# Altium footprint library Library 3D.PcbLib: 288 footprints (part 5 of 18)
Each footprint in its own frame and in the unit in brackets; x right, y up, seen from the top. Pads: shape width x height; smd on the part's side, far side on the other; paste and mask are expansions set on the pad; w line width, h text height; cw(c..) or ccw(c..) is an arc to the next point about the centre after c.
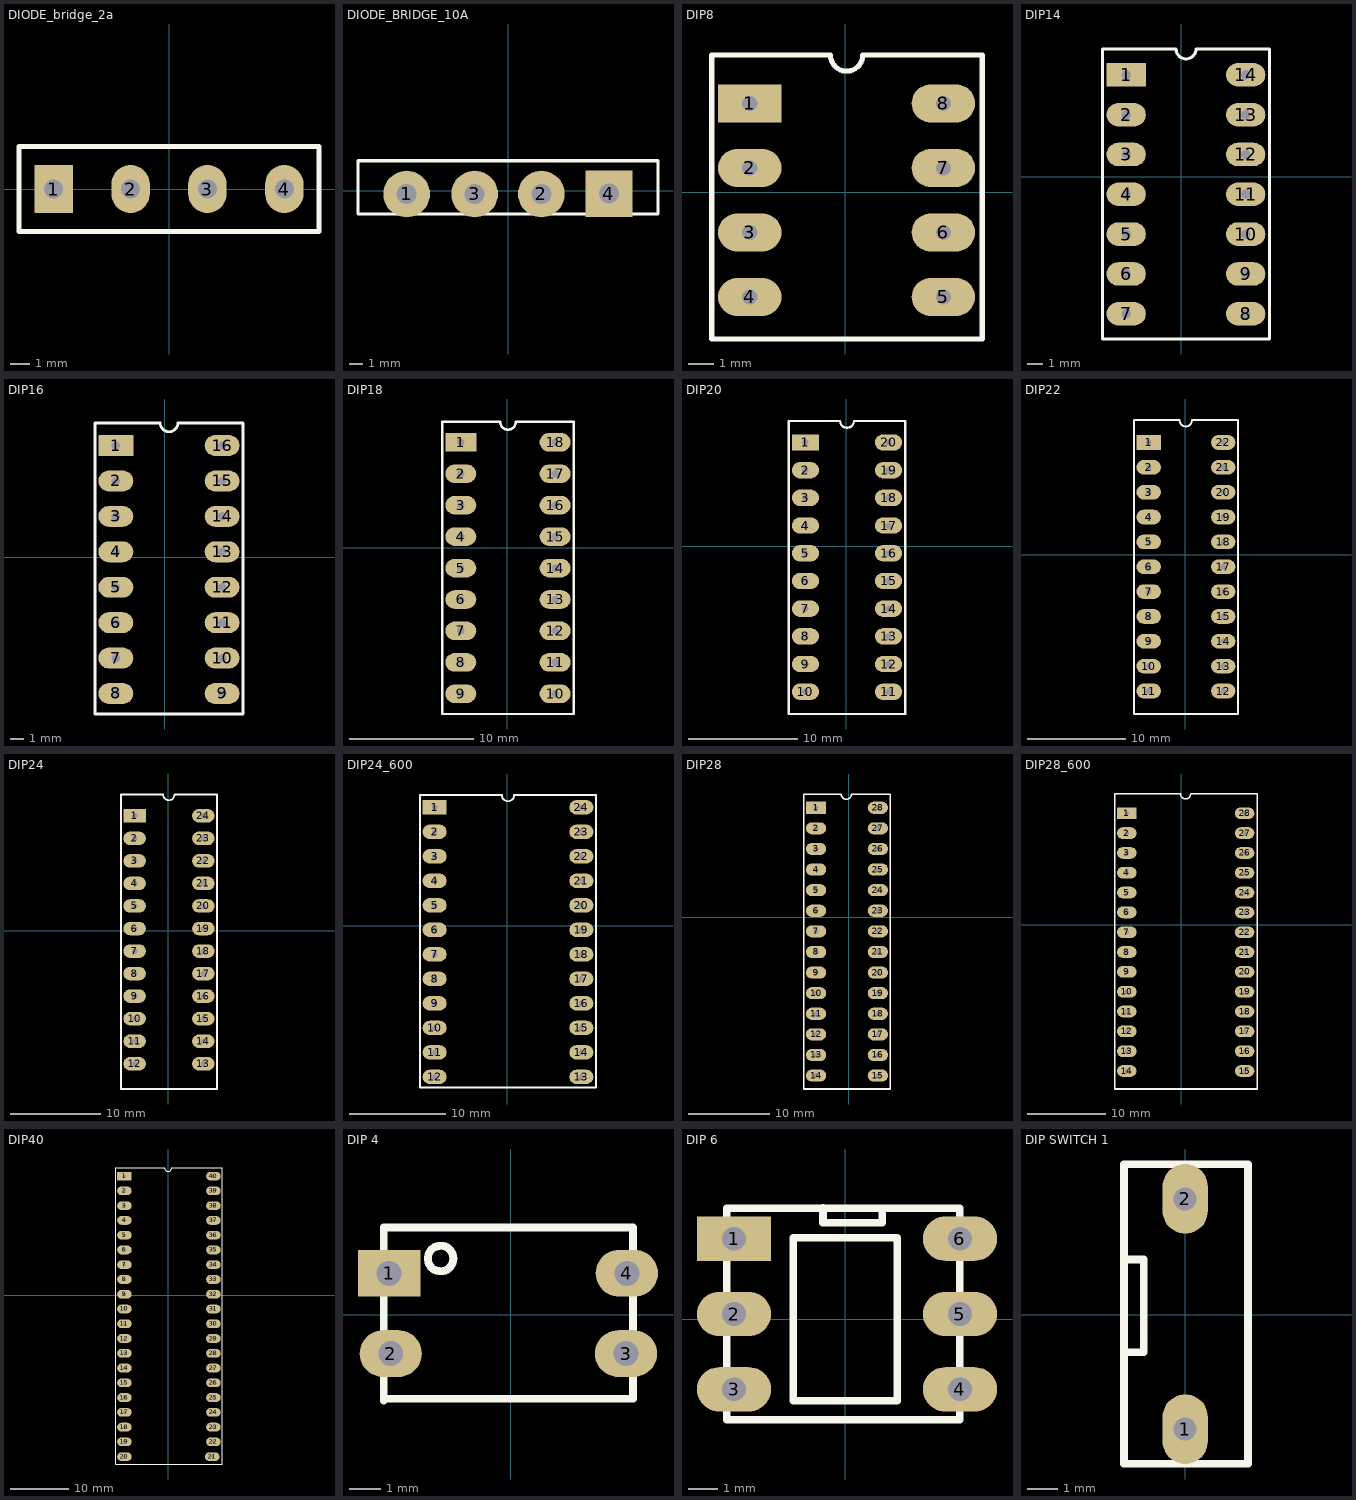
[diagram p4: the footprints below, top view; thin cyan lines are the x and y axes]

## DIODE_bridge_2a [mm]
pads (4):
  rect 2x2.5 hole 1: 1(-6,0)
  oval 2x2.5 hole 1: 2(-2,0) 3(2,0) 4(6,0)
Top Overlay:
  lines w0.254: -7.8,-2.2 7.8,-2.2 7.8,2.2 -7.8,2.2 -7.8,-2.2
3D body "Diode_Bridge.STEP": height 11, standoff -9, extent -7.5,-1.9 7.5,1.9

## DIODE_BRIDGE_10A [mm]
pads (4):
  round 3.5 hole 1.5: 1(-7.6,-0.25) 2(2.5,-0.25) 3(-2.5,-0.25)
  rect 3.5x3.5 hole 1.5: 4(7.575,-0.225)
Top Overlay:
  lines w0.254: -11.25,-1.75 11.25,-1.75 11.25,2.25 -11.25,2.25 -11.25,-1.75
3D body "User Library-GBU Vishay.STEP": height 21, standoff -15.55, extent -11.15,-1.5 11.15,2.06

## DIP8 [mm]
pads (8):
  rect 2.5x1.5 hole 0.6: 1(-3.75,3.5)
  oval 2.5x1.5 hole 0.6: 2(-3.75,0.96) 3(-3.75,-1.58) 4(-3.75,-4.12) 5(3.87,-4.12) 6(3.87,-1.58) 7(3.87,0.96) 8(3.87,3.5)
Top Overlay:
  lines w0.2: -5.25,-5.775 -5.25,5.4 -0.575,5.4 ccw(c0.06,5.4) 0.695,5.4 5.4,5.4 5.4,-5.775 -5.25,-5.775
3D body "User Library-DIP8-300-metric.STEP": height 4.5, standoff -3.5, extent -3.805,-5.6 3.955,5.2

## DIP14 [mm]
pads (14):
  rect 2.5x1.5 hole 0.6: 1(-3.5,6.5)
  oval 2.5x1.5 hole 0.6: 2(-3.5,3.96) 3(-3.5,1.42) 4(-3.5,-1.12) 5(-3.5,-3.66) 6(-3.5,-6.2) 7(-3.5,-8.74) 8(4.12,-8.74) 9(4.12,-6.2) 10(4.12,-3.66) 11(4.12,-1.12) 12(4.12,1.42) 13(4.12,3.96) 14(4.12,6.5)
Top Overlay:
  lines w0.2: -0.325,8.15 -5.025,8.15 -5.025,-10.35 5.65,-10.35 5.65,8.15 0.945,8.15 ; -0.32,8.15 ccw(c0.315,8.15) 0.95,8.15
3D body "User Library-DIP14-300-metric.STEP": height 4.5, standoff -3.5, extent -3.58,-10.125 4.18,7.975

## DIP16 [mm]
pads (16):
  rect 2.5x1.5 hole 0.6: 1(-3.5,8)
  oval 2.5x1.5 hole 0.6: 2(-3.5,5.46) 3(-3.5,2.92) 4(-3.5,0.38) 5(-3.5,-2.16) 6(-3.5,-4.7) 7(-3.5,-7.24) 8(-3.5,-9.78) 9(4.12,-9.78) 10(4.12,-7.24) 11(4.12,-4.7) 12(4.12,-2.16) 13(4.12,0.38) 14(4.12,2.92) 15(4.12,5.46) 16(4.12,8)
Top Overlay:
  lines w0.2: -0.325,9.625 -5,9.625 -5,-11.25 5.625,-11.25 5.625,9.625 0.945,9.625 ; -0.32,9.625 ccw(c0.315,9.625) 0.95,9.625
3D body "User Library-DIP16-300-metric.STEP": height 4.5, standoff -3.5, extent -3.555,-11.1 4.205,9.5

## DIP18 [mm]
pads (18):
  rect 2.5x1.5 hole 0.6: 1(-3.75,8.5)
  oval 2.5x1.5 hole 0.6: 2(-3.75,5.96) 3(-3.75,3.42) 4(-3.75,0.88) 5(-3.75,-1.66) 6(-3.75,-4.2) 7(-3.75,-6.74) 8(-3.75,-9.28) 9(-3.75,-11.82) 10(3.87,-11.82) 11(3.87,-9.28) 12(3.87,-6.74) 13(3.87,-4.2) 14(3.87,-1.66) 15(3.87,0.88) 16(3.87,3.42) 17(3.87,5.96) 18(3.87,8.5)
Top Overlay:
  lines w0.2: -5.25,-13.45 5.375,-13.45 5.375,10.15 0.695,10.15 cw(c0.06,10.15) -0.575,10.15 -5.25,10.15 -5.25,-13.45
3D body "User Library-DIP18-1.STEP": height 4.57, standoff -3.81, extent -3.81,-13.265 4.01,9.975

## DIP20 [mm]
pads (20):
  rect 2.5x1.5 hole 0.6: 1(-3.75,9.5)
  oval 2.5x1.5 hole 0.6: 2(-3.75,6.96) 3(-3.75,4.42) 4(-3.75,1.88) 5(-3.75,-0.66) 6(-3.75,-3.2) 7(-3.75,-5.74) 8(-3.75,-8.28) 9(-3.75,-10.82) 10(-3.75,-13.36) 11(3.87,-13.36) 12(3.87,-10.82) 13(3.87,-8.28) 14(3.87,-5.74) 15(3.87,-3.2) 16(3.87,-0.66) 17(3.87,1.88) 18(3.87,4.42) 19(3.87,6.96) 20(3.87,9.5)
Top Overlay:
  lines w0.2: -0.575,11.475 -5.275,11.475 -5.275,-15.4 5.4,-15.4 5.4,11.475 0.695,11.475 ; -0.57,11.475 ccw(c0.065,11.475) 0.7,11.475
3D body "User Library-DIP20.STEP": height 4.57, standoff -3.81, extent -3.81,-15.215 4.01,11.325

## DIP22 [mm]
pads (22):
  rect 2.5x1.5 hole 0.6: 1(-3.75,11.5)
  oval 2.5x1.5 hole 0.6: 2(-3.75,8.96) 3(-3.75,6.42) 4(-3.75,3.88) 5(-3.75,1.34) 6(-3.75,-1.2) 7(-3.75,-3.74) 8(-3.75,-6.28) 9(-3.75,-8.82) 10(-3.75,-11.36) 11(-3.75,-13.9) 12(3.87,-13.9) 13(3.87,-11.36) 14(3.87,-8.82) 15(3.87,-6.28) 16(3.87,-3.74) 17(3.87,-1.2) 18(3.87,1.34) 19(3.87,3.88) 20(3.87,6.42) 21(3.87,8.96) 22(3.87,11.5)
Top Overlay:
  lines w0.2: -0.595,13.775 ccw(c0.04,13.775) 0.675,13.775 ; -0.575,13.775 -5.275,13.775 -5.275,-16.25 5.4,-16.25 5.4,13.775 0.695,13.775
3D body "SW3dPS-DIP22P3.STEP": height 5.09, standoff -2.48, extent -3.845,-16.035 4.025,13.625

## DIP24 [mm]
pads (24):
  rect 2.5x1.5 hole 0.6: 1(-3.75,12.75)
  oval 2.5x1.5 hole 0.6: 2(-3.75,10.25) 3(-3.75,7.75) 4(-3.75,5.25) 5(-3.75,2.75) 6(-3.75,0.25) 7(-3.75,-2.25) 8(-3.75,-4.75) 9(-3.75,-7.25) 10(-3.75,-9.75) 11(-3.75,-12.25) 12(-3.75,-14.75) 13(3.87,-14.75) 14(3.87,-12.25) 15(3.87,-9.75) 16(3.87,-7.25) 17(3.87,-4.75) 18(3.87,-2.25) 19(3.87,0.25) 20(3.87,2.75) 21(3.87,5.25) 22(3.87,7.75) 23(3.87,10.25) 24(3.87,12.75)
Top Overlay:
  lines w0.2: -0.575,15.1 ccw(c0.05,15.1) 0.675,15.1 ; -0.565,15.1 -5.275,15.1 -5.275,-17.55 5.4,-17.55 5.4,15.1 0.685,15.1
3D body "SW3dPS-DIP24-300.STEP": height 5.08, standoff -2.49, extent -3.86,-17.335 4.01,14.925

## DIP24_600 [mm]
pads (24):
  rect 2.5x1.5 hole 0.6: 1(-7.5,12.25)
  oval 2.5x1.5 hole 0.6: 2(-7.5,9.71) 3(-7.5,7.17) 4(-7.5,4.63) 5(-7.5,2.09) 6(-7.5,-0.45) 7(-7.5,-2.99) 8(-7.5,-5.53) 9(-7.5,-8.07) 10(-7.5,-10.61) 11(-7.5,-13.15) 12(-7.5,-15.69) 13(7.7,-15.69) 14(7.7,-13.15) 15(7.7,-10.61) 16(7.7,-8.07) 17(7.7,-5.53) 18(7.7,-2.99) 19(7.7,-0.45) 20(7.7,2.09) 21(7.7,4.63) 22(7.7,7.17) 23(7.7,9.71) 24(7.7,12.25)
Top Overlay:
  lines w0.2: -9,-16.775 -9,13.52 -0.535,13.52 ccw(c0.1,13.52) 0.735,13.52 9.2,13.52 9.2,-16.775 -9,-16.775
3D body "User Library-DIP24-600-metric.STEP": height 5.5, standoff -3.9, extent -7.55,-16.525 7.75,13.475

## DIP28 [mm]
pads (28):
  rect 2.5x1.5 hole 0.6: 1(-4,13.5)
  oval 2.5x1.5 hole 0.6: 2(-4,10.96) 3(-4,8.42) 4(-4,5.88) 5(-4,3.34) 6(-4,0.8) 7(-4,-1.74) 8(-4,-4.28) 9(-4,-6.82) 10(-4,-9.36) 11(-4,-11.9) 12(-4,-14.44) 13(-4,-16.98) 14(-4,-19.52) 15(3.62,-19.52) 16(3.62,-16.98) 17(3.62,-14.44) 18(3.62,-11.9) 19(3.62,-9.36) 20(3.62,-6.82) 21(3.62,-4.28) 22(3.62,-1.74) 23(3.62,0.8) 24(3.62,3.34) 25(3.62,5.88) 26(3.62,8.42) 27(3.62,10.96) 28(3.62,13.5)
Top Overlay:
  lines w0.2: -5.5,-21.175 -5.5,15.175 -1.23,15.175 -0.9,15.175 ccw(c-0.265,15.175) 0.37,15.175 5.125,15.175 5.125,-21.175 -5.5,-21.175
3D body "SW3dPS-DIP28-300.STEP": height 5.08, standoff -2.49, extent -4.085,-20.975 3.785,15.025

## DIP28_600 [mm]
pads (28):
  rect 2.5x1.5 hole 0.6: 1(-7,14.25)
  oval 2.5x1.5 hole 0.6: 2(-7,11.71) 3(-7,9.17) 4(-7,6.63) 5(-7,4.09) 6(-7,1.55) 7(-7,-0.99) 8(-7,-3.53) 9(-7,-6.07) 10(-7,-8.61) 11(-7,-11.15) 12(-7,-13.69) 13(-7,-16.23) 14(-7,-18.77) 15(8.1,-18.77) 16(8.1,-16.23) 17(8.1,-13.69) 18(8.1,-11.15) 19(8.1,-8.61) 20(8.1,-6.07) 21(8.1,-3.53) 22(8.1,-0.99) 23(8.1,1.55) 24(8.1,4.09) 25(8.1,6.63) 26(8.1,9.17) 27(8.1,11.71) 28(8.1,14.25)
Top Overlay:
  lines w0.2: -0.095,16.725 ccw(c0.54,16.725) 1.175,16.725 ; -0.085,16.725 -8.525,16.725 -8.525,-21.075 9.7,-21.075 9.7,16.725 1.185,16.725
3D body "SW3dPS-DIP28-600.STEP": height 5.7, standoff -2.58, extent -7.22,-20.825 8.27,16.475

## DIP40 [mm]
pads (40):
  rect 2.5x1.5 hole 0.6: 1(-7.5,20.5)
  oval 2.5x1.5 hole 0.6: 2(-7.5,17.96) 3(-7.5,15.42) 4(-7.5,12.88) 5(-7.5,10.34) 6(-7.5,7.8) 7(-7.5,5.26) 8(-7.5,2.72) 9(-7.5,0.18) 10(-7.5,-2.36) 11(-7.5,-4.9) 12(-7.5,-7.44) 13(-7.5,-9.98) 14(-7.5,-12.52) 15(-7.5,-15.06) 16(-7.5,-17.6) 17(-7.5,-20.14) 18(-7.5,-22.68) 19(-7.5,-25.22) 20(-7.5,-27.76) 21(7.602,-27.76) 22(7.805,-25.22) 23(7.805,-22.68) 24(7.805,-20.14) 25(7.805,-17.6) 26(7.805,-15.06) 27(7.805,-12.52) 28(7.805,-9.98) 29(7.805,-7.44) 30(7.805,-4.9) 31(7.805,-2.36) 32(7.805,0.18) 33(7.805,2.72) 34(7.805,5.26) 35(7.805,7.8) 36(7.805,10.34) 37(7.805,12.88) 38(7.805,15.42) 39(7.805,17.96) 40(7.805,20.5)
Top Overlay:
  lines w0.2: -0.625,21.95 ccw(c0.01,21.95) 0.645,21.95 ; -0.625,21.975 -8.975,21.975 -8.975,-29.03 9.315,-29.03 9.315,21.95 0.815,21.95 0.65,21.95
3D body "SW3dPS-DIP40-600.STEP": height 5.7, standoff -2.58, extent -7.6,-29.842 7.89,22.608

## DIP 4 [mm]
pads (4):
  rect 2x1.5 hole 0.8: 1(-3.9,1.325)
  oval 2x1.5 hole 0.8: 2(-3.85,-1.25) 3(3.7,-1.25) 4(3.725,1.325)
Top Overlay:
  circle w0.254: c-2.25,1.8 r0.41
  lines w0.254: 3.925,-2.7 -4.025,-2.7 -4.075,-2.75 -4.075,2.79 3.925,2.79 3.925,-2.7 ; 3.925,-2.7 3.925,-2.7
3D body "SW3DPS-DIP4-DEFAULT.STEP": height 4.31, standoff -3.28, extent -4.075,-2.75 3.925,2.79

## DIP 6 [mm]
pads (6):
  rect 2.5x1.5 hole 0.8: 1(-3.75,2.71)
  oval 2.5x1.5 hole 0.8: 2(-3.75,0.17) 3(-3.75,-2.37) 4(3.87,-2.37) 5(3.87,0.17) 6(3.87,2.71)
Top Overlay:
  lines w0.254: -0.75,3.75 -0.75,3.25 -0.25,3.25 1.25,3.25 1.25,3.73 ; -4,-3.39 -4,3.73 ; -4,-3.39 -4,-3.39 ; -4,-3.39 3.87,-3.39 3.87,3.73 -4,3.73 ; -4,3.73 -4,3.73 ; -1.75,-2.75 -1.75,2.75 1.75,2.75 1.75,-2.75 -1.75,-2.75
3D body "User Library-DIP6-White.STEP": height 5.3, standoff -2, extent -4,-3.39 3.87,3.73

## DIP SWITCH 1 [mm]
pads (2):
  oval 1.5x2.3 hole 0.762: 1(0,-3.79) 2(0,3.83)
Top Overlay:
  lines w0.254: -2.007,-1.25 -1.372,-1.25 -1.372,1.823 -1.981,1.823 ; -2.024,-4.93 2.076,-4.93 2.076,4.97 -2.024,4.97 -2.024,-4.93
3D body "DIP SWITCH 1.STEP": height 7.2, standoff -3, extent -2.024,-4.93 2.076,4.97